# Altium schematic symbol library jlcpcb_2025_04_inductors_extended_0402.schlib: 1396 symbols (part 7 of 8) (continued)
## SDWL1005C5N1SSTFM01
designator L?  Inductance: 5.1nH
Inductor, 5.1nH, 120mΩ, 600mA, SMD 0402; Manufacturer: Sunlord; Manufacturer Part Number: SDWL1005C5N1SSTFM01; Package Size: 0402; JLCPCB Basic Part: No; JLCPCB Part Number: C408658; Supplier 1: LCSC; Category: Inductors; Supplier Part Number 1: C408658; Rated Current: 600mA; DC Resistance: 120mΩ; RoHS: Yes; ComponentLink1Description: Datasheet; ComponentLink1URL: https://wmsc.lcsc.com/wmsc/upload/file/pdf/v2/lcsc/2304140030_Sunlord-SDWL1005C5N1SSTFM01_C408658.pdf; ComponentLink2Description: JLCPCB Part URL; ComponentLink2URL: https://jlcpcb.com/partdetail/C408658; ComponentLink3Description: LCSC Part URL; ComponentLink3URL: https://lcsc.com/product-detail/Inductors-SMD_Sunlord-Sunlord-SDWL1005C5N1SSTFM01_C408658.html
footprint IND-0402 (0402 (1005M) Inductor)
pins: 1, 2

## SDWL1005C5N6JSTF
designator L?  Inductance: 5.6nH
Inductor, 5.6nH, ±5%, 78mΩ, 710mA, SMD 0402; Manufacturer: Sunlord; Manufacturer Part Number: SDWL1005C5N6JSTF; Package Size: 0402; JLCPCB Basic Part: No; JLCPCB Part Number: C370312; Supplier 1: LCSC; Category: Inductors; Supplier Part Number 1: C370312; Tolerance: ±5%; Rated Current: 710mA; DC Resistance: 78mΩ; RoHS: Yes; ComponentLink1Description: Datasheet; ComponentLink1URL: https://wmsc.lcsc.com/wmsc/upload/file/pdf/v2/lcsc/2304140030_Sunlord-SDWL1005C5N6JSTF_C370312.pdf; ComponentLink2Description: JLCPCB Part URL; ComponentLink2URL: https://jlcpcb.com/partdetail/C370312; ComponentLink3Description: LCSC Part URL; ComponentLink3URL: https://lcsc.com/product-detail/Inductors-SMD_Sunlord-Sunlord-SDWL1005C5N6JSTF_C370312.html
footprint IND-0402 (0402 (1005M) Inductor)
pins: 1, 2

## SDWL1005C5N8SSTFM01
designator L?  Inductance: 5.8nH
Inductor, 5.8nH, 120mΩ, 700mA, SMD 0402; Manufacturer: Sunlord; Manufacturer Part Number: SDWL1005C5N8SSTFM01; Package Size: 0402; JLCPCB Basic Part: No; JLCPCB Part Number: C408659; Supplier 1: LCSC; Category: Inductors; Supplier Part Number 1: C408659; Rated Current: 700mA; DC Resistance: 120mΩ; RoHS: Yes; ComponentLink1Description: Datasheet; ComponentLink1URL: https://wmsc.lcsc.com/wmsc/upload/file/pdf/v2/lcsc/2304140030_Sunlord-SDWL1005C5N8SSTFM01_C408659.pdf; ComponentLink2Description: JLCPCB Part URL; ComponentLink2URL: https://jlcpcb.com/partdetail/C408659; ComponentLink3Description: LCSC Part URL; ComponentLink3URL: https://lcsc.com/product-detail/Inductors-SMD_Sunlord-Sunlord-SDWL1005C5N8SSTFM01_C408659.html
footprint IND-0402 (0402 (1005M) Inductor)
pins: 1, 2

## SDWL1005C6N2SSTFM01
designator L?  Inductance: 6.2nH
Inductor, 6.2nH, 90mΩ, 700mA, SMD 0402; Manufacturer: Sunlord; Manufacturer Part Number: SDWL1005C6N2SSTFM01; Package Size: 0402; JLCPCB Basic Part: No; JLCPCB Part Number: C408660; Supplier 1: LCSC; Category: Inductors; Supplier Part Number 1: C408660; Rated Current: 700mA; DC Resistance: 90mΩ; RoHS: Yes; ComponentLink1Description: Datasheet; ComponentLink1URL: https://wmsc.lcsc.com/wmsc/upload/file/pdf/v2/lcsc/2304140030_Sunlord-SDWL1005C6N2SSTFM01_C408660.pdf; ComponentLink2Description: JLCPCB Part URL; ComponentLink2URL: https://jlcpcb.com/partdetail/C408660; ComponentLink3Description: LCSC Part URL; ComponentLink3URL: https://lcsc.com/product-detail/Inductors-SMD_Sunlord-Sunlord-SDWL1005C6N2SSTFM01_C408660.html
footprint IND-0402 (0402 (1005M) Inductor)
pins: 1, 2

## SDWL1005C6N3SSTFM01
designator L?  Inductance: 6.3nH
Inductor, 6.3nH, 90mΩ, 700mA, SMD 0402; Manufacturer: Sunlord; Manufacturer Part Number: SDWL1005C6N3SSTFM01; Package Size: 0402; JLCPCB Basic Part: No; JLCPCB Part Number: C408661; Supplier 1: LCSC; Category: Inductors; Supplier Part Number 1: C408661; Rated Current: 700mA; DC Resistance: 90mΩ; RoHS: Yes; ComponentLink1Description: Datasheet; ComponentLink1URL: https://wmsc.lcsc.com/wmsc/upload/file/pdf/v2/lcsc/2304140030_Sunlord-SDWL1005C6N3SSTFM01_C408661.pdf; ComponentLink2Description: JLCPCB Part URL; ComponentLink2URL: https://jlcpcb.com/partdetail/C408661; ComponentLink3Description: LCSC Part URL; ComponentLink3URL: https://lcsc.com/product-detail/Inductors-SMD_Sunlord-Sunlord-SDWL1005C6N3SSTFM01_C408661.html
footprint IND-0402 (0402 (1005M) Inductor)
pins: 1, 2

## SDWL1005C6N8GSTF
designator L?  Inductance: 6.8nH
Inductor, 6.8nH, ±2%, 105mΩ, 610mA, SMD 0402; Manufacturer: Sunlord; Manufacturer Part Number: SDWL1005C6N8GSTF; Package Size: 0402; JLCPCB Basic Part: No; JLCPCB Part Number: C361617; Supplier 1: LCSC; Category: Inductors; Supplier Part Number 1: C361617; Tolerance: ±2%; Rated Current: 610mA; DC Resistance: 105mΩ; RoHS: Yes; ComponentLink1Description: Datasheet; ComponentLink1URL: https://wmsc.lcsc.com/wmsc/upload/file/pdf/v2/lcsc/2304140030_Sunlord-SDWL1005C6N8GSTF_C361617.pdf; ComponentLink2Description: JLCPCB Part URL; ComponentLink2URL: https://jlcpcb.com/partdetail/C361617; ComponentLink3Description: LCSC Part URL; ComponentLink3URL: https://lcsc.com/product-detail/Inductors-SMD_Sunlord-Sunlord-SDWL1005C6N8GSTF_C361617.html
footprint IND-0402 (0402 (1005M) Inductor)
pins: 1, 2

## SDWL1005C7N3JSTFM01
designator L?  Inductance: 7.3nH
Inductor, 7.3nH, ±5%, 130mΩ, 570mA, SMD 0402; Manufacturer: Sunlord; Manufacturer Part Number: SDWL1005C7N3JSTFM01; Package Size: 0402; JLCPCB Basic Part: No; JLCPCB Part Number: C408670; Supplier 1: LCSC; Category: Inductors; Supplier Part Number 1: C408670; Tolerance: ±5%; Rated Current: 570mA; DC Resistance: 130mΩ; RoHS: Yes; ComponentLink1Description: Datasheet; ComponentLink1URL: https://wmsc.lcsc.com/wmsc/upload/file/pdf/v2/lcsc/2304140030_Sunlord-SDWL1005C7N3JSTFM01_C408670.pdf; ComponentLink2Description: JLCPCB Part URL; ComponentLink2URL: https://jlcpcb.com/partdetail/C408670; ComponentLink3Description: LCSC Part URL; ComponentLink3URL: https://lcsc.com/product-detail/Inductors-SMD_Sunlord-Sunlord-SDWL1005C7N3JSTFM01_C408670.html
footprint IND-0402 (0402 (1005M) Inductor)
pins: 1, 2

## SDWL1005C7N5JSTF
designator L?  Inductance: 7.5nH
Inductor, 7.5nH, ±5%, 120mΩ, 570mA, SMD 0402; Manufacturer: Sunlord; Manufacturer Part Number: SDWL1005C7N5JSTF; Package Size: 0402; JLCPCB Basic Part: No; JLCPCB Part Number: C370314; Supplier 1: LCSC; Category: Inductors; Supplier Part Number 1: C370314; Tolerance: ±5%; Rated Current: 570mA; DC Resistance: 120mΩ; RoHS: Yes; ComponentLink1Description: Datasheet; ComponentLink1URL: https://wmsc.lcsc.com/wmsc/upload/file/pdf/v2/lcsc/2304140030_Sunlord-SDWL1005C7N5JSTF_C370314.pdf; ComponentLink2Description: JLCPCB Part URL; ComponentLink2URL: https://jlcpcb.com/partdetail/C370314; ComponentLink3Description: LCSC Part URL; ComponentLink3URL: https://lcsc.com/product-detail/Inductors-SMD_Sunlord-Sunlord-SDWL1005C7N5JSTF_C370314.html
footprint IND-0402 (0402 (1005M) Inductor)
pins: 1, 2

## SDWL1005C7N5JSTFM01
designator L?  Inductance: 7.5nH
Inductor, 7.5nH, ±5%, 130mΩ, 570mA, SMD 0402; Manufacturer: Sunlord; Manufacturer Part Number: SDWL1005C7N5JSTFM01; Package Size: 0402; JLCPCB Basic Part: No; JLCPCB Part Number: C408671; Supplier 1: LCSC; Category: Inductors; Supplier Part Number 1: C408671; Tolerance: ±5%; Rated Current: 570mA; DC Resistance: 130mΩ; RoHS: Yes; ComponentLink1Description: Datasheet; ComponentLink1URL: https://wmsc.lcsc.com/wmsc/upload/file/pdf/v2/lcsc/2304140030_Sunlord-SDWL1005C7N5JSTFM01_C408671.pdf; ComponentLink2Description: JLCPCB Part URL; ComponentLink2URL: https://jlcpcb.com/partdetail/C408671; ComponentLink3Description: LCSC Part URL; ComponentLink3URL: https://lcsc.com/product-detail/Inductors-SMD_Sunlord-Sunlord-SDWL1005C7N5JSTFM01_C408671.html
footprint IND-0402 (0402 (1005M) Inductor)
pins: 1, 2

## SDWL1005C8N2GSTF
designator L?  Inductance: 8.2nH
Inductor, 8.2nH, ±2%, 110mΩ, 590mA, SMD 0402; Manufacturer: Sunlord; Manufacturer Part Number: SDWL1005C8N2GSTF; Package Size: 0402; JLCPCB Basic Part: No; JLCPCB Part Number: C316386; Supplier 1: LCSC; Category: Inductors; Supplier Part Number 1: C316386; Tolerance: ±2%; Rated Current: 590mA; DC Resistance: 110mΩ; RoHS: Yes; ComponentLink1Description: Datasheet; ComponentLink1URL: https://wmsc.lcsc.com/wmsc/upload/file/pdf/v2/lcsc/2304140030_Sunlord-SDWL1005C8N2GSTF_C316386.pdf; ComponentLink2Description: JLCPCB Part URL; ComponentLink2URL: https://jlcpcb.com/partdetail/C316386; ComponentLink3Description: LCSC Part URL; ComponentLink3URL: https://lcsc.com/product-detail/Inductors-SMD_Sunlord-Sunlord-SDWL1005C8N2GSTF_C316386.html
footprint IND-0402 (0402 (1005M) Inductor)
pins: 1, 2

## SDWL1005C8N2GSTFM01
designator L?  Inductance: 8.2nH
Inductor, 8.2nH, ±2%, 140mΩ, 540mA, SMD 0402; Manufacturer: Sunlord; Manufacturer Part Number: SDWL1005C8N2GSTFM01; Package Size: 0402; JLCPCB Basic Part: No; JLCPCB Part Number: C370315; Supplier 1: LCSC; Category: Inductors; Supplier Part Number 1: C370315; Tolerance: ±2%; Rated Current: 540mA; DC Resistance: 140mΩ; RoHS: Yes; ComponentLink1Description: Datasheet; ComponentLink1URL: https://wmsc.lcsc.com/wmsc/upload/file/pdf/v2/lcsc/1912111437_Sunlord-SDWL1005C8N2GSTFM01_C370315.pdf; ComponentLink2Description: JLCPCB Part URL; ComponentLink2URL: https://jlcpcb.com/partdetail/C370315; ComponentLink3Description: LCSC Part URL; ComponentLink3URL: https://lcsc.com/product-detail/Inductors-SMD_Sunlord-Sunlord-SDWL1005C8N2GSTFM01_C370315.html
footprint IND-0402 (0402 (1005M) Inductor)
pins: 1, 2

## SDWL1005C8N2JSTF
designator L?  Inductance: 8.2nH
Inductor, 8.2nH, ±5%, 110mΩ, 590mA, SMD 0402; Manufacturer: Sunlord; Manufacturer Part Number: SDWL1005C8N2JSTF; Package Size: 0402; JLCPCB Basic Part: No; JLCPCB Part Number: C361505; Supplier 1: LCSC; Category: Inductors; Supplier Part Number 1: C361505; Tolerance: ±5%; Rated Current: 590mA; DC Resistance: 110mΩ; RoHS: Yes; ComponentLink1Description: Datasheet; ComponentLink1URL: https://wmsc.lcsc.com/wmsc/upload/file/pdf/v2/lcsc/2304140030_Sunlord-SDWL1005C8N2JSTF_C361505.pdf; ComponentLink2Description: JLCPCB Part URL; ComponentLink2URL: https://jlcpcb.com/partdetail/C361505; ComponentLink3Description: LCSC Part URL; ComponentLink3URL: https://lcsc.com/product-detail/Inductors-SMD_Sunlord-Sunlord-SDWL1005C8N2JSTF_C361505.html
footprint IND-0402 (0402 (1005M) Inductor)
pins: 1, 2

## SDWL1005C8N2JSTFM01
designator L?  Inductance: 8.2nH
Inductor, 8.2nH, ±5%, 140mΩ, 540mA, SMD 0402; Manufacturer: Sunlord; Manufacturer Part Number: SDWL1005C8N2JSTFM01; Package Size: 0402; JLCPCB Basic Part: No; JLCPCB Part Number: C408672; Supplier 1: LCSC; Category: Inductors; Supplier Part Number 1: C408672; Tolerance: ±5%; Rated Current: 540mA; DC Resistance: 140mΩ; RoHS: Yes; ComponentLink1Description: Datasheet; ComponentLink1URL: https://wmsc.lcsc.com/wmsc/upload/file/pdf/v2/lcsc/2304140030_Sunlord-SDWL1005C8N2JSTFM01_C408672.pdf; ComponentLink2Description: JLCPCB Part URL; ComponentLink2URL: https://jlcpcb.com/partdetail/C408672; ComponentLink3Description: LCSC Part URL; ComponentLink3URL: https://lcsc.com/product-detail/Inductors-SMD_Sunlord-Sunlord-SDWL1005C8N2JSTFM01_C408672.html
footprint IND-0402 (0402 (1005M) Inductor)
pins: 1, 2

## SDWL1005C8N7JSTFM01
designator L?  Inductance: 8.7nH
Inductor, 8.7nH, ±5%, 140mΩ, 540mA, SMD 0402; Manufacturer: Sunlord; Manufacturer Part Number: SDWL1005C8N7JSTFM01; Package Size: 0402; JLCPCB Basic Part: No; JLCPCB Part Number: C408674; Supplier 1: LCSC; Category: Inductors; Supplier Part Number 1: C408674; Tolerance: ±5%; Rated Current: 540mA; DC Resistance: 140mΩ; RoHS: Yes; ComponentLink1Description: Datasheet; ComponentLink1URL: https://wmsc.lcsc.com/wmsc/upload/file/pdf/v2/lcsc/2304140030_Sunlord-SDWL1005C8N7JSTFM01_C408674.pdf; ComponentLink2Description: JLCPCB Part URL; ComponentLink2URL: https://jlcpcb.com/partdetail/C408674; ComponentLink3Description: LCSC Part URL; ComponentLink3URL: https://lcsc.com/product-detail/Inductors-SMD_Sunlord-Sunlord-SDWL1005C8N7JSTFM01_C408674.html
footprint IND-0402 (0402 (1005M) Inductor)
pins: 1, 2

## SDWL1005C8N8JSTFM01
designator L?  Inductance: 8.8nH
Inductor, 8.8nH, ±5%, 140mΩ, 540mA, SMD 0402; Manufacturer: Sunlord; Manufacturer Part Number: SDWL1005C8N8JSTFM01; Package Size: 0402; JLCPCB Basic Part: No; JLCPCB Part Number: C408675; Supplier 1: LCSC; Category: Inductors; Supplier Part Number 1: C408675; Tolerance: ±5%; Rated Current: 540mA; DC Resistance: 140mΩ; RoHS: Yes; ComponentLink1Description: Datasheet; ComponentLink1URL: https://wmsc.lcsc.com/wmsc/upload/file/pdf/v2/lcsc/2304140030_Sunlord-SDWL1005C8N8JSTFM01_C408675.pdf; ComponentLink2Description: JLCPCB Part URL; ComponentLink2URL: https://jlcpcb.com/partdetail/C408675; ComponentLink3Description: LCSC Part URL; ComponentLink3URL: https://lcsc.com/product-detail/Inductors-SMD_Sunlord-Sunlord-SDWL1005C8N8JSTFM01_C408675.html
footprint IND-0402 (0402 (1005M) Inductor)
pins: 1, 2

## SDWL1005C9N0JSTF
designator L?  Inductance: 9nH
Inductor, 9nH, ±5%, 110mΩ, 590mA, SMD 0402; Manufacturer: Sunlord; Manufacturer Part Number: SDWL1005C9N0JSTF; Self-Resonant Frequency: 5.5GHz; Q Factor: 25@250MHz; Package Size: 0402; JLCPCB Basic Part: No; JLCPCB Part Number: C2757920; Supplier 1: LCSC; Category: Inductors; Supplier Part Number 1: C2757920; Tolerance: ±5%; Rated Current: 590mA; DC Resistance: 110mΩ; RoHS: Yes; ComponentLink1Description: Datasheet; ComponentLink1URL: https://wmsc.lcsc.com/wmsc/upload/file/pdf/v2/lcsc/2304140030_Sunlord-SDWL1005C9N0JSTF_C2757920.pdf; ComponentLink2Description: JLCPCB Part URL; ComponentLink2URL: https://jlcpcb.com/partdetail/C2757920; ComponentLink3Description: LCSC Part URL; ComponentLink3URL: https://lcsc.com/product-detail/Inductors-SMD_Sunlord-Sunlord-SDWL1005C9N0JSTF_C2757920.html
footprint IND-0402 (0402 (1005M) Inductor)
pins: 1, 2

## SDWL1005C9N1JSTF
designator L?  Inductance: 9.1nH
Inductor, 9.1nH, ±5%, 110mΩ, 590mA, SMD 0402; Manufacturer: Sunlord; Manufacturer Part Number: SDWL1005C9N1JSTF; Package Size: 0402; JLCPCB Basic Part: No; JLCPCB Part Number: C361504; Supplier 1: LCSC; Category: Inductors; Supplier Part Number 1: C361504; Tolerance: ±5%; Rated Current: 590mA; DC Resistance: 110mΩ; RoHS: Yes; ComponentLink1Description: Datasheet; ComponentLink1URL: https://wmsc.lcsc.com/wmsc/upload/file/pdf/v2/lcsc/2304140030_Sunlord-SDWL1005C9N1JSTF_C361504.pdf; ComponentLink2Description: JLCPCB Part URL; ComponentLink2URL: https://jlcpcb.com/partdetail/C361504; ComponentLink3Description: LCSC Part URL; ComponentLink3URL: https://lcsc.com/product-detail/Inductors-SMD_Sunlord-Sunlord-SDWL1005C9N1JSTF_C361504.html
footprint IND-0402 (0402 (1005M) Inductor)
pins: 1, 2

## SDWL1005C9N2JSTFM01
designator L?  Inductance: 9.2nH
Inductor, 9.2nH, ±5%, 140mΩ, 540mA, SMD 0402; Manufacturer: Sunlord; Manufacturer Part Number: SDWL1005C9N2JSTFM01; Package Size: 0402; JLCPCB Basic Part: No; JLCPCB Part Number: C408679; Supplier 1: LCSC; Category: Inductors; Supplier Part Number 1: C408679; Tolerance: ±5%; Rated Current: 540mA; DC Resistance: 140mΩ; RoHS: Yes; ComponentLink1Description: Datasheet; ComponentLink1URL: https://wmsc.lcsc.com/wmsc/upload/file/pdf/v2/lcsc/2304140030_Sunlord-SDWL1005C9N2JSTFM01_C408679.pdf; ComponentLink2Description: JLCPCB Part URL; ComponentLink2URL: https://jlcpcb.com/partdetail/C408679; ComponentLink3Description: LCSC Part URL; ComponentLink3URL: https://lcsc.com/product-detail/Inductors-SMD_Sunlord-Sunlord-SDWL1005C9N2JSTFM01_C408679.html
footprint IND-0402 (0402 (1005M) Inductor)
pins: 1, 2

## SDWL1005C9N3JSTFM01
designator L?  Inductance: 9.3nH
Inductor, 9.3nH, ±5%, 140mΩ, 540mA, SMD 0402; Manufacturer: Sunlord; Manufacturer Part Number: SDWL1005C9N3JSTFM01; Package Size: 0402; JLCPCB Basic Part: No; JLCPCB Part Number: C408680; Supplier 1: LCSC; Category: Inductors; Supplier Part Number 1: C408680; Tolerance: ±5%; Rated Current: 540mA; DC Resistance: 140mΩ; RoHS: Yes; ComponentLink1Description: Datasheet; ComponentLink1URL: https://wmsc.lcsc.com/wmsc/upload/file/pdf/v2/lcsc/2304140030_Sunlord-SDWL1005C9N3JSTFM01_C408680.pdf; ComponentLink2Description: JLCPCB Part URL; ComponentLink2URL: https://jlcpcb.com/partdetail/C408680; ComponentLink3Description: LCSC Part URL; ComponentLink3URL: https://lcsc.com/product-detail/Inductors-SMD_Sunlord-Sunlord-SDWL1005C9N3JSTFM01_C408680.html
footprint IND-0402 (0402 (1005M) Inductor)
pins: 1, 2

## SDWL1005C9N4JSTFM01
designator L?  Inductance: 9.4nH
Inductor, 9.4nH, ±5%, 140mΩ, 540mA, SMD 0402; Manufacturer: Sunlord; Manufacturer Part Number: SDWL1005C9N4JSTFM01; Package Size: 0402; JLCPCB Basic Part: No; JLCPCB Part Number: C408681; Supplier 1: LCSC; Category: Inductors; Supplier Part Number 1: C408681; Tolerance: ±5%; Rated Current: 540mA; DC Resistance: 140mΩ; RoHS: Yes; ComponentLink1Description: Datasheet; ComponentLink1URL: https://wmsc.lcsc.com/wmsc/upload/file/pdf/v2/lcsc/2304140030_Sunlord-SDWL1005C9N4JSTFM01_C408681.pdf; ComponentLink2Description: JLCPCB Part URL; ComponentLink2URL: https://jlcpcb.com/partdetail/C408681; ComponentLink3Description: LCSC Part URL; ComponentLink3URL: https://lcsc.com/product-detail/Inductors-SMD_Sunlord-Sunlord-SDWL1005C9N4JSTFM01_C408681.html
footprint IND-0402 (0402 (1005M) Inductor)
pins: 1, 2

## SDWL1005C9N6JSTFM01
designator L?  Inductance: 9.6nH
Inductor, 9.6nH, ±5%, 140mΩ, 540mA, SMD 0402; Manufacturer: Sunlord; Manufacturer Part Number: SDWL1005C9N6JSTFM01; Package Size: 0402; JLCPCB Basic Part: No; JLCPCB Part Number: C408683; Supplier 1: LCSC; Category: Inductors; Supplier Part Number 1: C408683; Tolerance: ±5%; Rated Current: 540mA; DC Resistance: 140mΩ; RoHS: Yes; ComponentLink1Description: Datasheet; ComponentLink1URL: https://wmsc.lcsc.com/wmsc/upload/file/pdf/v2/lcsc/2304140030_Sunlord-SDWL1005C9N6JSTFM01_C408683.pdf; ComponentLink2Description: JLCPCB Part URL; ComponentLink2URL: https://jlcpcb.com/partdetail/C408683; ComponentLink3Description: LCSC Part URL; ComponentLink3URL: https://lcsc.com/product-detail/Inductors-SMD_Sunlord-Sunlord-SDWL1005C9N6JSTFM01_C408683.html
footprint IND-0402 (0402 (1005M) Inductor)
pins: 1, 2

## SDWL1005C9N7JSTFM01
designator L?  Inductance: 9.7nH
Inductor, 9.7nH, ±5%, 140mΩ, 540mA, SMD 0402; Manufacturer: Sunlord; Manufacturer Part Number: SDWL1005C9N7JSTFM01; Package Size: 0402; JLCPCB Basic Part: No; JLCPCB Part Number: C408684; Supplier 1: LCSC; Category: Inductors; Supplier Part Number 1: C408684; Tolerance: ±5%; Rated Current: 540mA; DC Resistance: 140mΩ; RoHS: Yes; ComponentLink1Description: Datasheet; ComponentLink1URL: https://wmsc.lcsc.com/wmsc/upload/file/pdf/v2/lcsc/2304140030_Sunlord-SDWL1005C9N7JSTFM01_C408684.pdf; ComponentLink2Description: JLCPCB Part URL; ComponentLink2URL: https://jlcpcb.com/partdetail/C408684; ComponentLink3Description: LCSC Part URL; ComponentLink3URL: https://lcsc.com/product-detail/Inductors-SMD_Sunlord-Sunlord-SDWL1005C9N7JSTFM01_C408684.html
footprint IND-0402 (0402 (1005M) Inductor)
pins: 1, 2

## SDWL1005C9N8JSTFM01
designator L?  Inductance: 9.8nH
Inductor, 9.8nH, ±5%, 140mΩ, 540mA, SMD 0402; Manufacturer: Sunlord; Manufacturer Part Number: SDWL1005C9N8JSTFM01; Package Size: 0402; JLCPCB Basic Part: No; JLCPCB Part Number: C408685; Supplier 1: LCSC; Category: Inductors; Supplier Part Number 1: C408685; Tolerance: ±5%; Rated Current: 540mA; DC Resistance: 140mΩ; RoHS: Yes; ComponentLink1Description: Datasheet; ComponentLink1URL: https://wmsc.lcsc.com/wmsc/upload/file/pdf/v2/lcsc/2304140030_Sunlord-SDWL1005C9N8JSTFM01_C408685.pdf; ComponentLink2Description: JLCPCB Part URL; ComponentLink2URL: https://jlcpcb.com/partdetail/C408685; ComponentLink3Description: LCSC Part URL; ComponentLink3URL: https://lcsc.com/product-detail/Inductors-SMD_Sunlord-Sunlord-SDWL1005C9N8JSTFM01_C408685.html
footprint IND-0402 (0402 (1005M) Inductor)
pins: 1, 2

## SDWL1005C9N9JSTFM01
designator L?  Inductance: 9.9nH
Inductor, 9.9nH, ±5%, 140mΩ, 540mA, SMD 0402; Manufacturer: Sunlord; Manufacturer Part Number: SDWL1005C9N9JSTFM01; Package Size: 0402; JLCPCB Basic Part: No; JLCPCB Part Number: C408686; Supplier 1: LCSC; Category: Inductors; Supplier Part Number 1: C408686; Tolerance: ±5%; Rated Current: 540mA; DC Resistance: 140mΩ; RoHS: Yes; ComponentLink1Description: Datasheet; ComponentLink1URL: https://wmsc.lcsc.com/wmsc/upload/file/pdf/v2/lcsc/2304140030_Sunlord-SDWL1005C9N9JSTFM01_C408686.pdf; ComponentLink2Description: JLCPCB Part URL; ComponentLink2URL: https://jlcpcb.com/partdetail/C408686; ComponentLink3Description: LCSC Part URL; ComponentLink3URL: https://lcsc.com/product-detail/Inductors-SMD_Sunlord-Sunlord-SDWL1005C9N9JSTFM01_C408686.html
footprint IND-0402 (0402 (1005M) Inductor)
pins: 1, 2

## SDWL1005C10NGSTF
designator L?  Inductance: 10nH
Inductor, 10nH, ±2%, 150mΩ, 510mA, SMD 0402; Manufacturer: Sunlord; Manufacturer Part Number: SDWL1005C10NGSTF; Package Size: 0402; JLCPCB Basic Part: No; JLCPCB Part Number: C316391; Supplier 1: LCSC; Category: Inductors; Supplier Part Number 1: C316391; Tolerance: ±2%; Rated Current: 510mA; DC Resistance: 150mΩ; RoHS: Yes; ComponentLink1Description: Datasheet; ComponentLink1URL: https://wmsc.lcsc.com/wmsc/upload/file/pdf/v2/lcsc/2304140030_Sunlord-SDWL1005C10NGSTF_C316391.pdf; ComponentLink2Description: JLCPCB Part URL; ComponentLink2URL: https://jlcpcb.com/partdetail/C316391; ComponentLink3Description: LCSC Part URL; ComponentLink3URL: https://lcsc.com/product-detail/Inductors-SMD_Sunlord-Sunlord-SDWL1005C10NGSTF_C316391.html
footprint IND-0402 (0402 (1005M) Inductor)
pins: 1, 2

## SDWL1005C10NJSTF
designator L?  Inductance: 10nH
Inductor, 10nH, ±5%, 150mΩ, 510mA, SMD 0402; Manufacturer: Sunlord; Manufacturer Part Number: SDWL1005C10NJSTF; Package Size: 0402; JLCPCB Basic Part: No; JLCPCB Part Number: C361500; Supplier 1: LCSC; Category: Inductors; Supplier Part Number 1: C361500; Tolerance: ±5%; Rated Current: 510mA; DC Resistance: 150mΩ; RoHS: Yes; ComponentLink1Description: Datasheet; ComponentLink1URL: https://wmsc.lcsc.com/wmsc/upload/file/pdf/v2/lcsc/2304140030_Sunlord-SDWL1005C10NJSTF_C361500.pdf; ComponentLink2Description: JLCPCB Part URL; ComponentLink2URL: https://jlcpcb.com/partdetail/C361500; ComponentLink3Description: LCSC Part URL; ComponentLink3URL: https://lcsc.com/product-detail/Inductors-SMD_Sunlord-Sunlord-SDWL1005C10NJSTF_C361500.html
footprint IND-0402 (0402 (1005M) Inductor)
pins: 1, 2

## SDWL1005C10NJSTFM01
designator L?  Inductance: 10nH
Inductor, 10nH, ±5%, SMD 0402; Manufacturer: Sunlord; Manufacturer Part Number: SDWL1005C10NJSTFM01; Package Size: 0402; JLCPCB Basic Part: No; JLCPCB Part Number: C305132; Supplier 1: LCSC; Category: Inductors; Supplier Part Number 1: C305132; Tolerance: ±5%; RoHS: Yes; ComponentLink1Description: Datasheet; ComponentLink2Description: JLCPCB Part URL; ComponentLink2URL: https://jlcpcb.com/partdetail/C305132; ComponentLink3Description: LCSC Part URL; ComponentLink3URL: https://lcsc.com/product-detail/Inductors-SMD_Sunlord-Sunlord-SDWL1005C10NJSTFM01_C305132.html
footprint IND-0402 (0402 (1005M) Inductor)
pins: 1, 2

## SDWL1005C12NJSTF
designator L?  Inductance: 12nH
Inductor, 12nH, ±5%, 120mΩ, 570mA, SMD 0402; Manufacturer: Sunlord; Manufacturer Part Number: SDWL1005C12NJSTF; Package Size: 0402; JLCPCB Basic Part: No; JLCPCB Part Number: C95943; Supplier 1: LCSC; Category: Inductors; Supplier Part Number 1: C95943; Tolerance: ±5%; Rated Current: 570mA; DC Resistance: 120mΩ; RoHS: Yes; ComponentLink1Description: Datasheet; ComponentLink1URL: https://wmsc.lcsc.com/wmsc/upload/file/pdf/v2/lcsc/2304140030_Sunlord-SDWL1005C12NJSTF_C95943.pdf; ComponentLink2Description: JLCPCB Part URL; ComponentLink2URL: https://jlcpcb.com/partdetail/C95943; ComponentLink3Description: LCSC Part URL; ComponentLink3URL: https://lcsc.com/product-detail/Inductors-SMD_Sunlord-Sunlord-SDWL1005C12NJSTF_C95943.html
footprint IND-0402 (0402 (1005M) Inductor)
pins: 1, 2

## SDWL1005C15NJSTF
designator L?  Inductance: 15nH
Inductor, 15nH, ±5%, 210mΩ, 430mA, SMD 0402; Manufacturer: Sunlord; Manufacturer Part Number: SDWL1005C15NJSTF; Package Size: 0402; JLCPCB Basic Part: No; JLCPCB Part Number: C98204; Supplier 1: LCSC; Category: Inductors; Supplier Part Number 1: C98204; Tolerance: ±5%; Rated Current: 430mA; DC Resistance: 210mΩ; RoHS: Yes; ComponentLink1Description: Datasheet; ComponentLink1URL: https://wmsc.lcsc.com/wmsc/upload/file/pdf/v2/lcsc/2304140030_Sunlord-SDWL1005C15NJSTF_C98204.pdf; ComponentLink2Description: JLCPCB Part URL; ComponentLink2URL: https://jlcpcb.com/partdetail/C98204; ComponentLink3Description: LCSC Part URL; ComponentLink3URL: https://lcsc.com/product-detail/Inductors-SMD_Sunlord-Sunlord-SDWL1005C15NJSTF_C98204.html
footprint IND-0402 (0402 (1005M) Inductor)
pins: 1, 2

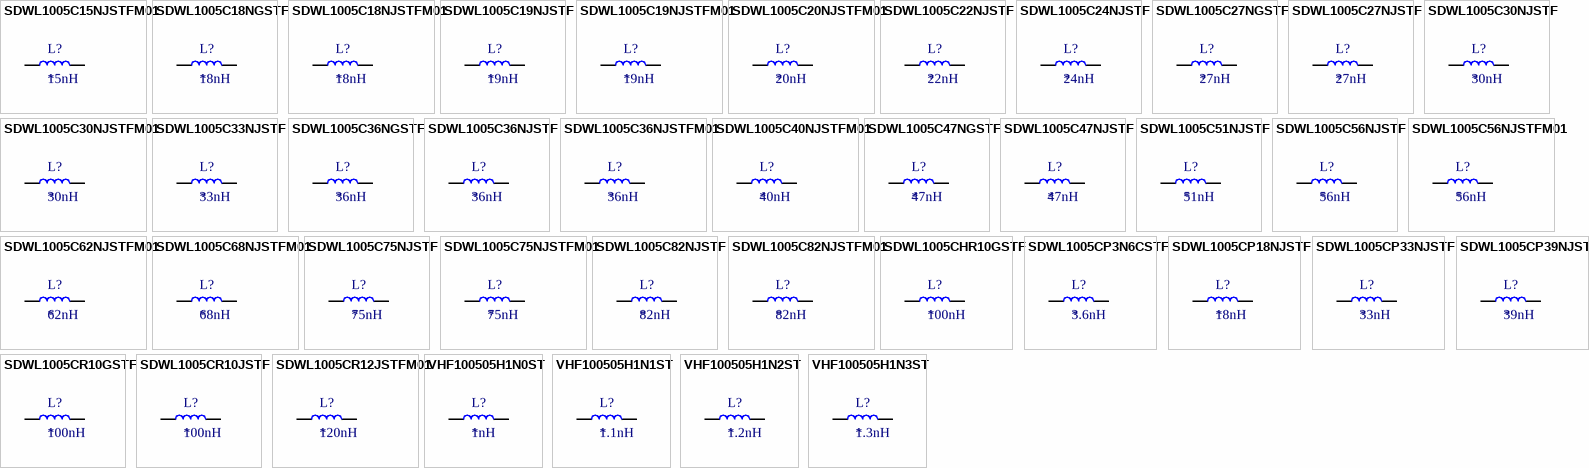
[diagram p31: symbols SDWL1005C15NJSTFM01 to VHF100505H1N3ST]

## SDWL1005C15NJSTFM01
designator L?  Inductance: 15nH
Inductor, 15nH, ±5%, 160mΩ, 460mA, SMD 0402; Manufacturer: Sunlord; Manufacturer Part Number: SDWL1005C15NJSTFM01; Package Size: 0402; JLCPCB Basic Part: No; JLCPCB Part Number: C408689; Supplier 1: LCSC; Category: Inductors; Supplier Part Number 1: C408689; Tolerance: ±5%; Rated Current: 460mA; DC Resistance: 160mΩ; RoHS: Yes; ComponentLink1Description: Datasheet; ComponentLink1URL: https://wmsc.lcsc.com/wmsc/upload/file/pdf/v2/lcsc/2304140030_Sunlord-SDWL1005C15NJSTFM01_C408689.pdf; ComponentLink2Description: JLCPCB Part URL; ComponentLink2URL: https://jlcpcb.com/partdetail/C408689; ComponentLink3Description: LCSC Part URL; ComponentLink3URL: https://lcsc.com/product-detail/Inductors-SMD_Sunlord-Sunlord-SDWL1005C15NJSTFM01_C408689.html
footprint IND-0402 (0402 (1005M) Inductor)
pins: 1, 2

## SDWL1005C18NGSTF
designator L?  Inductance: 18nH
Inductor, 18nH, ±2%, 280mΩ, 370mA, SMD 0402; Manufacturer: Sunlord; Manufacturer Part Number: SDWL1005C18NGSTF; Package Size: 0402; JLCPCB Basic Part: No; JLCPCB Part Number: C361616; Supplier 1: LCSC; Category: Inductors; Supplier Part Number 1: C361616; Tolerance: ±2%; Rated Current: 370mA; DC Resistance: 280mΩ; RoHS: Yes; ComponentLink1Description: Datasheet; ComponentLink1URL: https://wmsc.lcsc.com/wmsc/upload/file/pdf/v2/lcsc/2304140030_Sunlord-SDWL1005C18NGSTF_C361616.pdf; ComponentLink2Description: JLCPCB Part URL; ComponentLink2URL: https://jlcpcb.com/partdetail/C361616; ComponentLink3Description: LCSC Part URL; ComponentLink3URL: https://lcsc.com/product-detail/Inductors-SMD_Sunlord-Sunlord-SDWL1005C18NGSTF_C361616.html
footprint IND-0402 (0402 (1005M) Inductor)
pins: 1, 2

## SDWL1005C18NJSTFM01
designator L?  Inductance: 18nH
Inductor, 18nH, ±5%, 270mΩ, 370mA, SMD 0402; Manufacturer: Sunlord; Manufacturer Part Number: SDWL1005C18NJSTFM01; Package Size: 0402; JLCPCB Basic Part: No; JLCPCB Part Number: C408691; Supplier 1: LCSC; Category: Inductors; Supplier Part Number 1: C408691; Tolerance: ±5%; Rated Current: 370mA; DC Resistance: 270mΩ; RoHS: Yes; ComponentLink1Description: Datasheet; ComponentLink1URL: https://wmsc.lcsc.com/wmsc/upload/file/pdf/v2/lcsc/2304140030_Sunlord-SDWL1005C18NJSTFM01_C408691.pdf; ComponentLink2Description: JLCPCB Part URL; ComponentLink2URL: https://jlcpcb.com/partdetail/C408691; ComponentLink3Description: LCSC Part URL; ComponentLink3URL: https://lcsc.com/product-detail/Inductors-SMD_Sunlord-Sunlord-SDWL1005C18NJSTFM01_C408691.html
footprint IND-0402 (0402 (1005M) Inductor)
pins: 1, 2

## SDWL1005C19NJSTF
designator L?  Inductance: 19nH
Inductor, 19nH, ±5%, 240mΩ, 400mA, SMD 0402; Manufacturer: Sunlord; Manufacturer Part Number: SDWL1005C19NJSTF; Package Size: 0402; JLCPCB Basic Part: No; JLCPCB Part Number: C361503; Supplier 1: LCSC; Category: Inductors; Supplier Part Number 1: C361503; Tolerance: ±5%; Rated Current: 400mA; DC Resistance: 240mΩ; RoHS: Yes; ComponentLink1Description: Datasheet; ComponentLink1URL: https://wmsc.lcsc.com/wmsc/upload/file/pdf/v2/lcsc/2304140030_Sunlord-SDWL1005C19NJSTF_C361503.pdf; ComponentLink2Description: JLCPCB Part URL; ComponentLink2URL: https://jlcpcb.com/partdetail/C361503; ComponentLink3Description: LCSC Part URL; ComponentLink3URL: https://lcsc.com/product-detail/Inductors-SMD_Sunlord-Sunlord-SDWL1005C19NJSTF_C361503.html
footprint IND-0402 (0402 (1005M) Inductor)
pins: 1, 2

## SDWL1005C19NJSTFM01
designator L?  Inductance: 19nH
Inductor, 19nH, ±5%, 270mΩ, 370mA, SMD 0402; Manufacturer: Sunlord; Manufacturer Part Number: SDWL1005C19NJSTFM01; Package Size: 0402; JLCPCB Basic Part: No; JLCPCB Part Number: C408692; Supplier 1: LCSC; Category: Inductors; Supplier Part Number 1: C408692; Tolerance: ±5%; Rated Current: 370mA; DC Resistance: 270mΩ; RoHS: Yes; ComponentLink1Description: Datasheet; ComponentLink1URL: https://wmsc.lcsc.com/wmsc/upload/file/pdf/v2/lcsc/2304140030_Sunlord-SDWL1005C19NJSTFM01_C408692.pdf; ComponentLink2Description: JLCPCB Part URL; ComponentLink2URL: https://jlcpcb.com/partdetail/C408692; ComponentLink3Description: LCSC Part URL; ComponentLink3URL: https://lcsc.com/product-detail/Inductors-SMD_Sunlord-Sunlord-SDWL1005C19NJSTFM01_C408692.html
footprint IND-0402 (0402 (1005M) Inductor)
pins: 1, 2

## SDWL1005C20NJSTFM01
designator L?  Inductance: 20nH
Inductor, 20nH, ±5%, 270mΩ, 370mA, SMD 0402; Manufacturer: Sunlord; Manufacturer Part Number: SDWL1005C20NJSTFM01; Package Size: 0402; JLCPCB Basic Part: No; JLCPCB Part Number: C408693; Supplier 1: LCSC; Category: Inductors; Supplier Part Number 1: C408693; Tolerance: ±5%; Rated Current: 370mA; DC Resistance: 270mΩ; RoHS: Yes; ComponentLink1Description: Datasheet; ComponentLink1URL: https://wmsc.lcsc.com/wmsc/upload/file/pdf/v2/lcsc/2304140030_Sunlord-SDWL1005C20NJSTFM01_C408693.pdf; ComponentLink2Description: JLCPCB Part URL; ComponentLink2URL: https://jlcpcb.com/partdetail/C408693; ComponentLink3Description: LCSC Part URL; ComponentLink3URL: https://lcsc.com/product-detail/Inductors-SMD_Sunlord-Sunlord-SDWL1005C20NJSTFM01_C408693.html
footprint IND-0402 (0402 (1005M) Inductor)
pins: 1, 2

## SDWL1005C22NJSTF
designator L?  Inductance: 22nH
Inductor, 22nH, ±5%, 360mΩ, 330mA, SMD 0402; Manufacturer: Sunlord; Manufacturer Part Number: SDWL1005C22NJSTF; Package Size: 0402; JLCPCB Basic Part: No; JLCPCB Part Number: C279783; Supplier 1: LCSC; Category: Inductors; Supplier Part Number 1: C279783; Tolerance: ±5%; Rated Current: 330mA; DC Resistance: 360mΩ; RoHS: Yes; ComponentLink1Description: Datasheet; ComponentLink1URL: https://wmsc.lcsc.com/wmsc/upload/file/pdf/v2/lcsc/2304140030_Sunlord-SDWL1005C22NJSTF_C279783.pdf; ComponentLink2Description: JLCPCB Part URL; ComponentLink2URL: https://jlcpcb.com/partdetail/C279783; ComponentLink3Description: LCSC Part URL; ComponentLink3URL: https://lcsc.com/product-detail/Inductors-SMD_Sunlord-Sunlord-SDWL1005C22NJSTF_C279783.html
footprint IND-0402 (0402 (1005M) Inductor)
pins: 1, 2

## SDWL1005C24NJSTF
designator L?  Inductance: 24nH
Inductor, 24nH, ±5%, 360mΩ, 330mA, SMD 0402; Manufacturer: Sunlord; Manufacturer Part Number: SDWL1005C24NJSTF; Package Size: 0402; JLCPCB Basic Part: No; JLCPCB Part Number: C370295; Supplier 1: LCSC; Category: Inductors; Supplier Part Number 1: C370295; Tolerance: ±5%; Rated Current: 330mA; DC Resistance: 360mΩ; RoHS: Yes; ComponentLink1Description: Datasheet; ComponentLink1URL: https://wmsc.lcsc.com/wmsc/upload/file/pdf/v2/lcsc/2304140030_Sunlord-SDWL1005C24NJSTF_C370295.pdf; ComponentLink2Description: JLCPCB Part URL; ComponentLink2URL: https://jlcpcb.com/partdetail/C370295; ComponentLink3Description: LCSC Part URL; ComponentLink3URL: https://lcsc.com/product-detail/Inductors-SMD_Sunlord-Sunlord-SDWL1005C24NJSTF_C370295.html
footprint IND-0402 (0402 (1005M) Inductor)
pins: 1, 2

## SDWL1005C27NGSTF
designator L?  Inductance: 27nH
Inductor, 27nH, ±2%, 380mΩ, 320mA, SMD 0402; Manufacturer: Sunlord; Manufacturer Part Number: SDWL1005C27NGSTF; Package Size: 0402; JLCPCB Basic Part: No; JLCPCB Part Number: C95944; Supplier 1: LCSC; Category: Inductors; Supplier Part Number 1: C95944; Tolerance: ±2%; Rated Current: 320mA; DC Resistance: 380mΩ; RoHS: Yes; ComponentLink1Description: Datasheet; ComponentLink1URL: https://wmsc.lcsc.com/wmsc/upload/file/pdf/v2/lcsc/2304140030_Sunlord-SDWL1005C27NGSTF_C95944.pdf; ComponentLink2Description: JLCPCB Part URL; ComponentLink2URL: https://jlcpcb.com/partdetail/C95944; ComponentLink3Description: LCSC Part URL; ComponentLink3URL: https://lcsc.com/product-detail/Inductors-SMD_Sunlord-Sunlord-SDWL1005C27NGSTF_C95944.html
footprint IND-0402 (0402 (1005M) Inductor)
pins: 1, 2

## SDWL1005C27NJSTF
designator L?  Inductance: 27nH
Inductor, 27nH, ±5%, 380mΩ, 320mA, SMD 0402; Manufacturer: Sunlord; Manufacturer Part Number: SDWL1005C27NJSTF; Package Size: 0402; JLCPCB Basic Part: No; JLCPCB Part Number: C54976; Supplier 1: LCSC; Category: Inductors; Supplier Part Number 1: C54976; Tolerance: ±5%; Rated Current: 320mA; DC Resistance: 380mΩ; RoHS: Yes; ComponentLink1Description: Datasheet; ComponentLink1URL: https://wmsc.lcsc.com/wmsc/upload/file/pdf/v2/lcsc/2304140030_Sunlord-SDWL1005C27NJSTF_C54976.pdf; ComponentLink2Description: JLCPCB Part URL; ComponentLink2URL: https://jlcpcb.com/partdetail/C54976; ComponentLink3Description: LCSC Part URL; ComponentLink3URL: https://lcsc.com/product-detail/Inductors-SMD_Sunlord-Sunlord-SDWL1005C27NJSTF_C54976.html
footprint IND-0402 (0402 (1005M) Inductor)
pins: 1, 2

## SDWL1005C30NJSTF
designator L?  Inductance: 30nH
Inductor, 30nH, ±5%, 380mΩ, 320mA, SMD 0402; Manufacturer: Sunlord; Manufacturer Part Number: SDWL1005C30NJSTF; Package Size: 0402; JLCPCB Basic Part: No; JLCPCB Part Number: C361501; Supplier 1: LCSC; Category: Inductors; Supplier Part Number 1: C361501; Tolerance: ±5%; Rated Current: 320mA; DC Resistance: 380mΩ; RoHS: Yes; ComponentLink1Description: Datasheet; ComponentLink1URL: https://wmsc.lcsc.com/wmsc/upload/file/pdf/v2/lcsc/2304140030_Sunlord-SDWL1005C30NJSTF_C361501.pdf; ComponentLink2Description: JLCPCB Part URL; ComponentLink2URL: https://jlcpcb.com/partdetail/C361501; ComponentLink3Description: LCSC Part URL; ComponentLink3URL: https://lcsc.com/product-detail/Inductors-SMD_Sunlord-Sunlord-SDWL1005C30NJSTF_C361501.html
footprint IND-0402 (0402 (1005M) Inductor)
pins: 1, 2

## SDWL1005C30NJSTFM01
designator L?  Inductance: 30nH
Inductor, 30nH, ±5%, 580mΩ, 270mA, SMD 0402; Manufacturer: Sunlord; Manufacturer Part Number: SDWL1005C30NJSTFM01; Package Size: 0402; JLCPCB Basic Part: No; JLCPCB Part Number: C408698; Supplier 1: LCSC; Category: Inductors; Supplier Part Number 1: C408698; Tolerance: ±5%; Rated Current: 270mA; DC Resistance: 580mΩ; RoHS: Yes; ComponentLink1Description: Datasheet; ComponentLink1URL: https://wmsc.lcsc.com/wmsc/upload/file/pdf/v2/lcsc/2304140030_Sunlord-SDWL1005C30NJSTFM01_C408698.pdf; ComponentLink2Description: JLCPCB Part URL; ComponentLink2URL: https://jlcpcb.com/partdetail/C408698; ComponentLink3Description: LCSC Part URL; ComponentLink3URL: https://lcsc.com/product-detail/Inductors-SMD_Sunlord-Sunlord-SDWL1005C30NJSTFM01_C408698.html
footprint IND-0402 (0402 (1005M) Inductor)
pins: 1, 2

## SDWL1005C33NJSTF
designator L?  Inductance: 33nH
Inductor, 33nH, ±5%, 550mΩ, 260mA, SMD 0402; Manufacturer: Sunlord; Manufacturer Part Number: SDWL1005C33NJSTF; Package Size: 0402; JLCPCB Basic Part: No; JLCPCB Part Number: C54974; Supplier 1: LCSC; Category: Inductors; Supplier Part Number 1: C54974; Tolerance: ±5%; Rated Current: 260mA; DC Resistance: 550mΩ; RoHS: Yes; ComponentLink1Description: Datasheet; ComponentLink1URL: https://wmsc.lcsc.com/wmsc/upload/file/pdf/v2/lcsc/2304140030_Sunlord-SDWL1005C33NJSTF_C54974.pdf; ComponentLink2Description: JLCPCB Part URL; ComponentLink2URL: https://jlcpcb.com/partdetail/C54974; ComponentLink3Description: LCSC Part URL; ComponentLink3URL: https://lcsc.com/product-detail/Inductors-SMD_Sunlord-Sunlord-SDWL1005C33NJSTF_C54974.html
footprint IND-0402 (0402 (1005M) Inductor)
pins: 1, 2

## SDWL1005C36NGSTF
designator L?  Inductance: 36nH
Inductor, 36nH, ±2%, 600mΩ, 250mA, SMD 0402; Manufacturer: Sunlord; Manufacturer Part Number: SDWL1005C36NGSTF; Package Size: 0402; JLCPCB Basic Part: No; JLCPCB Part Number: C95946; Supplier 1: LCSC; Category: Inductors; Supplier Part Number 1: C95946; Tolerance: ±2%; Rated Current: 250mA; DC Resistance: 600mΩ; RoHS: Yes; ComponentLink1Description: Datasheet; ComponentLink1URL: https://wmsc.lcsc.com/wmsc/upload/file/pdf/v2/lcsc/2304140030_Sunlord-SDWL1005C36NGSTF_C95946.pdf; ComponentLink2Description: JLCPCB Part URL; ComponentLink2URL: https://jlcpcb.com/partdetail/C95946; ComponentLink3Description: LCSC Part URL; ComponentLink3URL: https://lcsc.com/product-detail/Inductors-SMD_Sunlord-Sunlord-SDWL1005C36NGSTF_C95946.html
footprint IND-0402 (0402 (1005M) Inductor)
pins: 1, 2

## SDWL1005C36NJSTF
designator L?  Inductance: 36nH
Inductor, 36nH, ±5%, 600mΩ, 250mA, SMD 0402; Manufacturer: Sunlord; Manufacturer Part Number: SDWL1005C36NJSTF; Package Size: 0402; JLCPCB Basic Part: No; JLCPCB Part Number: C431685; Supplier 1: LCSC; Category: Inductors; Supplier Part Number 1: C431685; Tolerance: ±5%; Rated Current: 250mA; DC Resistance: 600mΩ; RoHS: Yes; ComponentLink1Description: Datasheet; ComponentLink1URL: https://wmsc.lcsc.com/wmsc/upload/file/pdf/v2/lcsc/2304140030_Sunlord-SDWL1005C36NJSTF_C431685.pdf; ComponentLink2Description: JLCPCB Part URL; ComponentLink2URL: https://jlcpcb.com/partdetail/C431685; ComponentLink3Description: LCSC Part URL; ComponentLink3URL: https://lcsc.com/product-detail/Inductors-SMD_Sunlord-Sunlord-SDWL1005C36NJSTF_C431685.html
footprint IND-0402 (0402 (1005M) Inductor)
pins: 1, 2

## SDWL1005C36NJSTFM01
designator L?  Inductance: 36nH
Inductor, 36nH, ±5%, 630mΩ, 260mA, SMD 0402; Manufacturer: Sunlord; Manufacturer Part Number: SDWL1005C36NJSTFM01; Package Size: 0402; JLCPCB Basic Part: No; JLCPCB Part Number: C408700; Supplier 1: LCSC; Category: Inductors; Supplier Part Number 1: C408700; Tolerance: ±5%; Rated Current: 260mA; DC Resistance: 630mΩ; RoHS: Yes; ComponentLink1Description: Datasheet; ComponentLink1URL: https://wmsc.lcsc.com/wmsc/upload/file/pdf/v2/lcsc/2304140030_Sunlord-SDWL1005C36NJSTFM01_C408700.pdf; ComponentLink2Description: JLCPCB Part URL; ComponentLink2URL: https://jlcpcb.com/partdetail/C408700; ComponentLink3Description: LCSC Part URL; ComponentLink3URL: https://lcsc.com/product-detail/Inductors-SMD_Sunlord-Sunlord-SDWL1005C36NJSTFM01_C408700.html
footprint IND-0402 (0402 (1005M) Inductor)
pins: 1, 2

## SDWL1005C40NJSTFM01
designator L?  Inductance: 40nH
Inductor, 40nH, ±5%, 700mΩ, 250mA, SMD 0402; Manufacturer: Sunlord; Manufacturer Part Number: SDWL1005C40NJSTFM01; Package Size: 0402; JLCPCB Basic Part: No; JLCPCB Part Number: C408702; Supplier 1: LCSC; Category: Inductors; Supplier Part Number 1: C408702; Tolerance: ±5%; Rated Current: 250mA; DC Resistance: 700mΩ; RoHS: Yes; ComponentLink1Description: Datasheet; ComponentLink1URL: https://wmsc.lcsc.com/wmsc/upload/file/pdf/v2/lcsc/2304140030_Sunlord-SDWL1005C40NJSTFM01_C408702.pdf; ComponentLink2Description: JLCPCB Part URL; ComponentLink2URL: https://jlcpcb.com/partdetail/C408702; ComponentLink3Description: LCSC Part URL; ComponentLink3URL: https://lcsc.com/product-detail/Inductors-SMD_Sunlord-Sunlord-SDWL1005C40NJSTFM01_C408702.html
footprint IND-0402 (0402 (1005M) Inductor)
pins: 1, 2

## SDWL1005C47NGSTF
designator L?  Inductance: 47nH
Inductor, 47nH, ±2%, 950mΩ, 200mA, SMD 0402; Manufacturer: Sunlord; Manufacturer Part Number: SDWL1005C47NGSTF; Package Size: 0402; JLCPCB Basic Part: No; JLCPCB Part Number: C95948; Supplier 1: LCSC; Category: Inductors; Supplier Part Number 1: C95948; Tolerance: ±2%; Rated Current: 200mA; DC Resistance: 950mΩ; RoHS: Yes; ComponentLink1Description: Datasheet; ComponentLink1URL: https://wmsc.lcsc.com/wmsc/upload/file/pdf/v2/lcsc/2304140030_Sunlord-SDWL1005C47NGSTF_C95948.pdf; ComponentLink2Description: JLCPCB Part URL; ComponentLink2URL: https://jlcpcb.com/partdetail/C95948; ComponentLink3Description: LCSC Part URL; ComponentLink3URL: https://lcsc.com/product-detail/Inductors-SMD_Sunlord-Sunlord-SDWL1005C47NGSTF_C95948.html
footprint IND-0402 (0402 (1005M) Inductor)
pins: 1, 2

## SDWL1005C47NJSTF
designator L?  Inductance: 47nH
Inductor, 47nH, ±5%, 950mΩ, 200mA, SMD 0402; Manufacturer: Sunlord; Manufacturer Part Number: SDWL1005C47NJSTF; Package Size: 0402; JLCPCB Basic Part: No; JLCPCB Part Number: C54973; Supplier 1: LCSC; Category: Inductors; Supplier Part Number 1: C54973; Tolerance: ±5%; Rated Current: 200mA; DC Resistance: 950mΩ; RoHS: Yes; ComponentLink1Description: Datasheet; ComponentLink1URL: https://wmsc.lcsc.com/wmsc/upload/file/pdf/v2/lcsc/2304140030_Sunlord-SDWL1005C47NJSTF_C54973.pdf; ComponentLink2Description: JLCPCB Part URL; ComponentLink2URL: https://jlcpcb.com/partdetail/C54973; ComponentLink3Description: LCSC Part URL; ComponentLink3URL: https://lcsc.com/product-detail/Inductors-SMD_Sunlord-Sunlord-SDWL1005C47NJSTF_C54973.html
footprint IND-0402 (0402 (1005M) Inductor)
pins: 1, 2

## SDWL1005C51NJSTF
designator L?  Inductance: 51nH
Inductor, 51nH, ±5%, 950mΩ, 200mA, SMD 0402; Manufacturer: Sunlord; Manufacturer Part Number: SDWL1005C51NJSTF; Package Size: 0402; JLCPCB Basic Part: No; JLCPCB Part Number: C370310; Supplier 1: LCSC; Category: Inductors; Supplier Part Number 1: C370310; Tolerance: ±5%; Rated Current: 200mA; DC Resistance: 950mΩ; RoHS: Yes; ComponentLink1Description: Datasheet; ComponentLink1URL: https://wmsc.lcsc.com/wmsc/upload/file/pdf/v2/lcsc/2304140030_Sunlord-SDWL1005C51NJSTF_C370310.pdf; ComponentLink2Description: JLCPCB Part URL; ComponentLink2URL: https://jlcpcb.com/partdetail/C370310; ComponentLink3Description: LCSC Part URL; ComponentLink3URL: https://lcsc.com/product-detail/Inductors-SMD_Sunlord-Sunlord-SDWL1005C51NJSTF_C370310.html
footprint IND-0402 (0402 (1005M) Inductor)
pins: 1, 2

## SDWL1005C56NJSTF
designator L?  Inductance: 56nH
Inductor, 56nH, ±5%, 1.05Ω, 190mA, SMD 0402; Manufacturer: Sunlord; Manufacturer Part Number: SDWL1005C56NJSTF; Package Size: 0402; JLCPCB Basic Part: No; JLCPCB Part Number: C98205; Supplier 1: LCSC; Category: Inductors; Supplier Part Number 1: C98205; Tolerance: ±5%; Rated Current: 190mA; DC Resistance: 1.05Ω; RoHS: Yes; ComponentLink1Description: Datasheet; ComponentLink1URL: https://wmsc.lcsc.com/wmsc/upload/file/pdf/v2/lcsc/1811021715_Sunlord-SDWL1005C56NJSTF_C98205.pdf; ComponentLink2Description: JLCPCB Part URL; ComponentLink2URL: https://jlcpcb.com/partdetail/C98205; ComponentLink3Description: LCSC Part URL; ComponentLink3URL: https://lcsc.com/product-detail/Inductors-SMD_Sunlord-Sunlord-SDWL1005C56NJSTF_C98205.html
footprint IND-0402 (0402 (1005M) Inductor)
pins: 1, 2

## SDWL1005C56NJSTFM01
designator L?  Inductance: 56nH
Inductor, 56nH, ±5%, 1.17Ω, 200mA, SMD 0402; Manufacturer: Sunlord; Manufacturer Part Number: SDWL1005C56NJSTFM01; Package Size: 0402; JLCPCB Basic Part: No; JLCPCB Part Number: C408706; Supplier 1: LCSC; Category: Inductors; Supplier Part Number 1: C408706; Tolerance: ±5%; Rated Current: 200mA; DC Resistance: 1.17Ω; RoHS: Yes; ComponentLink1Description: Datasheet; ComponentLink1URL: https://wmsc.lcsc.com/wmsc/upload/file/pdf/v2/lcsc/2304140030_Sunlord-SDWL1005C56NJSTFM01_C408706.pdf; ComponentLink2Description: JLCPCB Part URL; ComponentLink2URL: https://jlcpcb.com/partdetail/C408706; ComponentLink3Description: LCSC Part URL; ComponentLink3URL: https://lcsc.com/product-detail/Inductors-SMD_Sunlord-Sunlord-SDWL1005C56NJSTFM01_C408706.html
footprint IND-0402 (0402 (1005M) Inductor)
pins: 1, 2

## SDWL1005C62NJSTFM01
designator L?  Inductance: 62nH
Inductor, 62nH, ±5%, 1.82Ω, 145mA, SMD 0402; Manufacturer: Sunlord; Manufacturer Part Number: SDWL1005C62NJSTFM01; Package Size: 0402; JLCPCB Basic Part: No; JLCPCB Part Number: C408707; Supplier 1: LCSC; Category: Inductors; Supplier Part Number 1: C408707; Tolerance: ±5%; Rated Current: 145mA; DC Resistance: 1.82Ω; RoHS: Yes; ComponentLink1Description: Datasheet; ComponentLink1URL: https://wmsc.lcsc.com/wmsc/upload/file/pdf/v2/lcsc/2304140030_Sunlord-SDWL1005C62NJSTFM01_C408707.pdf; ComponentLink2Description: JLCPCB Part URL; ComponentLink2URL: https://jlcpcb.com/partdetail/C408707; ComponentLink3Description: LCSC Part URL; ComponentLink3URL: https://lcsc.com/product-detail/Inductors-SMD_Sunlord-Sunlord-SDWL1005C62NJSTFM01_C408707.html
footprint IND-0402 (0402 (1005M) Inductor)
pins: 1, 2

## SDWL1005C68NJSTFM01
designator L?  Inductance: 68nH
Inductor, 68nH, ±5%, 1.96Ω, 140mA, SMD 0402; Manufacturer: Sunlord; Manufacturer Part Number: SDWL1005C68NJSTFM01; Package Size: 0402; JLCPCB Basic Part: No; JLCPCB Part Number: C370313; Supplier 1: LCSC; Category: Inductors; Supplier Part Number 1: C370313; Tolerance: ±5%; Rated Current: 140mA; DC Resistance: 1.96Ω; RoHS: Yes; ComponentLink1Description: Datasheet; ComponentLink1URL: https://wmsc.lcsc.com/wmsc/upload/file/pdf/v2/lcsc/2304140030_Sunlord-SDWL1005C68NJSTFM01_C370313.pdf; ComponentLink2Description: JLCPCB Part URL; ComponentLink2URL: https://jlcpcb.com/partdetail/C370313; ComponentLink3Description: LCSC Part URL; ComponentLink3URL: https://lcsc.com/product-detail/Inductors-SMD_Sunlord-Sunlord-SDWL1005C68NJSTFM01_C370313.html
footprint IND-0402 (0402 (1005M) Inductor)
pins: 1, 2

## SDWL1005C75NJSTF
designator L?  Inductance: 75nH
Inductor, 75nH, ±5%, 1.75Ω, 140mA, SMD 0402; Manufacturer: Sunlord; Manufacturer Part Number: SDWL1005C75NJSTF; Package Size: 0402; JLCPCB Basic Part: No; JLCPCB Part Number: C391207; Supplier 1: LCSC; Category: Inductors; Supplier Part Number 1: C391207; Tolerance: ±5%; Rated Current: 140mA; DC Resistance: 1.75Ω; RoHS: Yes; ComponentLink1Description: Datasheet; ComponentLink1URL: https://wmsc.lcsc.com/wmsc/upload/file/pdf/v2/lcsc/2304140030_Sunlord-SDWL1005C75NJSTF_C391207.pdf; ComponentLink2Description: JLCPCB Part URL; ComponentLink2URL: https://jlcpcb.com/partdetail/C391207; ComponentLink3Description: LCSC Part URL; ComponentLink3URL: https://lcsc.com/product-detail/Inductors-SMD_Sunlord-Sunlord-SDWL1005C75NJSTF_C391207.html
footprint IND-0402 (0402 (1005M) Inductor)
pins: 1, 2

## SDWL1005C75NJSTFM01
designator L?  Inductance: 75nH
Inductor, 75nH, ±5%, 2.1Ω, 135mA, SMD 0402; Manufacturer: Sunlord; Manufacturer Part Number: SDWL1005C75NJSTFM01; Package Size: 0402; JLCPCB Basic Part: No; JLCPCB Part Number: C408709; Supplier 1: LCSC; Category: Inductors; Supplier Part Number 1: C408709; Tolerance: ±5%; Rated Current: 135mA; DC Resistance: 2.1Ω; RoHS: Yes; ComponentLink1Description: Datasheet; ComponentLink1URL: https://wmsc.lcsc.com/wmsc/upload/file/pdf/v2/lcsc/2304140030_Sunlord-SDWL1005C75NJSTFM01_C408709.pdf; ComponentLink2Description: JLCPCB Part URL; ComponentLink2URL: https://jlcpcb.com/partdetail/C408709; ComponentLink3Description: LCSC Part URL; ComponentLink3URL: https://lcsc.com/product-detail/Inductors-SMD_Sunlord-Sunlord-SDWL1005C75NJSTFM01_C408709.html
footprint IND-0402 (0402 (1005M) Inductor)
pins: 1, 2
